# Altium footprint library ref-packages.PCBLIB: 1544 footprints (part 69 of 103)
Each footprint in its own frame and in the unit in brackets; x right, y up, seen from the top. Pads: shape width x height; smd on the part's side, far side on the other; paste and mask are expansions set on the pad; w line width, h text height; cw(c..) or ccw(c..) is an arc to the next point about the centre after c.
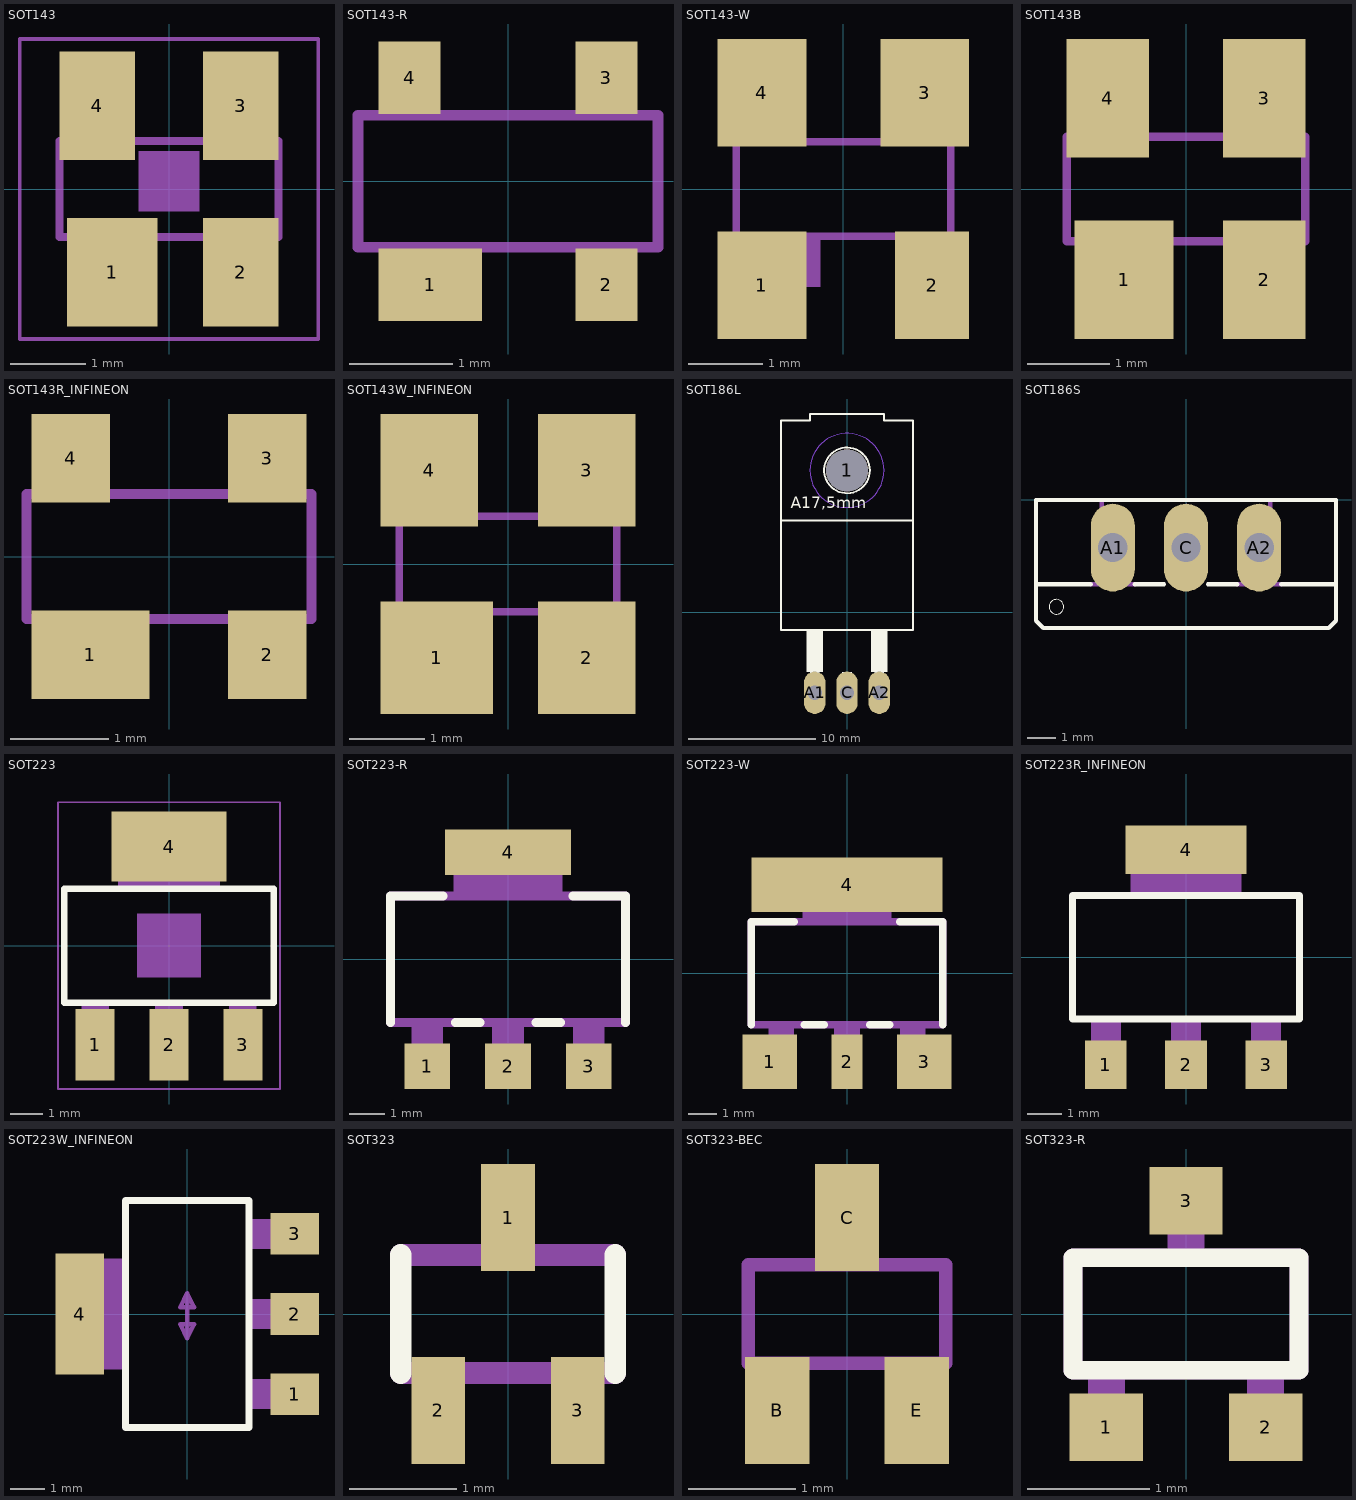
[diagram p68: the footprints below, top view; thin cyan lines are the x and y axes]

## SOT143 [mm]
pads (4):
  rect 1.2x1.44 smd: 1(-0.75,-1.1)
  rect 1x1.44 smd: 2(0.95,-1.1) 3(0.95,1.1) 4(-0.95,1.1)
Mechanical 6:
  rectangle: -0.4,-0.3 0.4,0.5
Mechanical 16:
  rectangle: 0.737,-1.321 1.194,-0.635
  rectangle: 0.711,0.635 1.168,1.321
  rectangle: -1.143,0.635 -0.686,1.321
  rectangle: -1.194,-1.321 -0.305,-0.635
  lines w0.102: -1.448,-0.635 1.448,-0.635 1.448,0.635 -1.448,0.635 -1.448,-0.635
Mechanical 27:
  lines w0.051: -1.973,-1.983 1.973,-1.983 1.973,1.983 -1.973,1.983 -1.973,-1.983

## SOT143-R [mm]
pads (4):
  rect 1x0.7 smd: 1(-0.75,-1)
  rect 0.6x0.7 smd: 2(0.95,-1) 3(0.95,1) 4(-0.95,1)
Mechanical 16:
  rectangle: 0.737,-1.321 1.194,-0.635
  rectangle: 0.711,0.635 1.168,1.321
  rectangle: -1.143,0.635 -0.686,1.321
  rectangle: -1.194,-1.321 -0.305,-0.635
  lines w0.102: -1.448,-0.635 1.448,-0.635 1.448,0.635 -1.448,0.635 -1.448,-0.635

## SOT143-W [mm]
pads (4):
  rect 1.2x1.45 smd: 1(-1.1,-1.3) 3(1.1,1.3) 4(-1.1,1.3)
  rect 1x1.45 smd: 2(1.2,-1.3)
Mechanical 16:
  rectangle: 0.737,-1.321 1.194,-0.635
  rectangle: 0.711,0.635 1.168,1.321
  rectangle: -1.143,0.635 -0.686,1.321
  rectangle: -1.194,-1.321 -0.305,-0.635
  lines w0.102: -1.448,-0.635 1.448,-0.635 1.448,0.635 -1.448,0.635 -1.448,-0.635

## SOT143B [mm]
pads (4):
  rect 1.2x1.44 smd: 1(-0.75,-1.1)
  rect 1x1.44 smd: 2(0.95,-1.1) 3(0.95,1.1) 4(-0.95,1.1)
Mechanical 16:
  rectangle: 0.737,-1.321 1.194,-0.635
  rectangle: 0.711,0.635 1.168,1.321
  rectangle: -1.143,0.635 -0.686,1.321
  rectangle: -1.194,-1.321 -0.305,-0.635
  lines w0.102: -1.448,-0.635 1.448,-0.635 1.448,0.635 -1.448,0.635 -1.448,-0.635

## SOT143R_INFINEON [mm]
pads (4):
  rect 1.2x0.9 smd: 1(-0.8,-1)
  rect 0.8x0.9 smd: 2(1,-1) 3(1,1) 4(-1,1)
Mechanical 16:
  rectangle: 0.737,-1.321 1.194,-0.635
  rectangle: 0.711,0.635 1.168,1.321
  rectangle: -1.143,0.635 -0.686,1.321
  rectangle: -1.194,-1.321 -0.305,-0.635
  lines w0.102: -1.448,-0.635 -1.448,0.635 1.448,0.635 1.448,-0.635 -1.448,-0.635

## SOT143W_INFINEON [mil]
pads (4):
  rect 59.06x59.06 smd: 1(-37.4,-49.21)
  rect 51.18x59.06 smd: 2(41.34,-49.21) 3(41.34,49.21) 4(-41.34,49.21)
Mechanical 16:
  rectangle: 29,-52 47,-25
  rectangle: 28,25 46,52
  rectangle: -45,25 -27,52
  rectangle: -47,-52 -12,-25
  lines w4: -57,-25 57,-25 57,25 -57,25 -57,-25

## SOT186L [mil]
pads (4):
  round 130 hole 130: 1(0,440)
  oval 66x132 hole 44: A1(-100,-250) A2(100,-250) C(0,-250)
Bottom Layer keep-out:
  circle w0: c0,440 r115
Top Overlay:
  circle w6: c0,440 r71
  rectangle: -125,-185 -75,-55
  rectangle: 75,-185 125,-55
  rectangle: 85,-190 115,-185
  rectangle: -115,-190 -85,-185
  rectangle: -15,-190 15,-185
  lines w6: -205,285 -205,-55 205,-55 205,285 ; -205,285 205,285 ; -205,285 -205,595 -115,595 -115,615 115,615 115,595 205,595 205,285
  text "A17,5mm" at -175,310 h60.45
Mechanical 16:
  rectangle: 85,-255 115,-190
  rectangle: -115,-255 -85,-190
  rectangle: -15,-255 15,-190
Via Holes:
  circle w0: c0,440 r115

## SOT186S [mil]
pads (3):
  oval 60x120 hole 40: A1(-100,-65) A2(100,-65) C(0,-65)
Top Overlay:
  circle w0: c-177,-146 r10
  lines w6: -130,-115 -205,-115 ; -70,-115 -30,-115 ; 30,-115 70,-115 ; 130,-115 205,-115 ; -205,-115 -205,-165 -195,-175 195,-175 205,-165 205,-115 ; -205,-115 -205,0 205,0 205,-115
Mechanical 16:
  lines w6: -130,-115 -115,-115 ; -115,0 -115,-115 ; -70,-115 -115,-115 ; 70,-115 115,-115 ; 115,0 115,-115 ; 130,-115 115,-115

## SOT223 [mil]
pads (4):
  rect 47.99x87.99 smd: 1(-90.98,-122.01) 2(0,-122.01) 3(90.98,-122.01)
  rect 141.73x86.61 smd: 4(0,122.01)
Top Overlay:
  lines w8: -129.02,-70 129.02,-70 129.02,70 -129.02,70 -129.02,-70
Mechanical 6:
  rectangle: -39.37,-39.37 39.37,39.37
Mechanical 16:
  rectangle: -63,71 63,144
  rectangle: -17,-144 17,-71
  rectangle: -108,-144 -74,-71
  rectangle: 74,-144 108,-71
  rectangle: -63,71 63,144
  rectangle: -17,-144 17,-71
  rectangle: -108,-144 -74,-71
  rectangle: 74,-144 108,-71
Mechanical 27:
  lines w2: -136.73,-176.5 136.73,-176.5 136.73,176.5 -136.73,176.5 -136.73,-176.5

## SOT223-R [mil]
pads (4):
  rect 51.18x51.18 smd: 1(-90.55,-120.08) 2(0,-120.08) 3(90.55,-120.08)
  rect 141.73x51.18 smd: 4(0,120.08)
Top Overlay:
  lines w10: -131.89,-70.87 -131.89,70.87 -72.83,70.87 ; -59.06,-70.87 -31.5,-70.87 ; 31.5,-70.87 59.06,-70.87 ; 72.83,70.87 131.89,70.87 131.89,-70.87
Mechanical 16:
  rectangle: -108.27,-135.83 -72.83,-74.8
  rectangle: -17.72,-135.83 17.72,-74.8
  rectangle: 72.83,-135.83 108.27,-74.8
  rectangle: -61.02,74.8 61.02,135.83
  lines w10: -131.89,-70.87 -131.89,70.87 131.89,70.87 131.89,-70.87 -131.89,-70.87

## SOT223-W [mm]
pads (4):
  rect 1.9x1.9 smd: 1(-2.7,-3.1) 3(2.7,-3.1)
  rect 1.1x1.9 smd: 2(0,-3.1)
  rect 6.7x1.9 smd: 4(0,3.1)
Top Overlay:
  lines w0.254: -3.35,-1.8 -3.35,1.8 -1.85,1.8 ; -1.5,-1.8 -0.8,-1.8 ; 0.8,-1.8 1.5,-1.8 ; 1.85,1.8 3.35,1.8 3.35,-1.8
Mechanical 16:
  rectangle: -2.75,-3.45 -1.85,-1.9
  rectangle: -0.45,-3.45 0.45,-1.9
  rectangle: 1.85,-3.45 2.75,-1.9
  rectangle: -1.55,1.9 1.55,3.45
  lines w0.254: -3.35,-1.8 -3.35,1.8 3.35,1.8 3.35,-1.8 -3.35,-1.8

## SOT223R_INFINEON [mil]
pads (4):
  rect 47.24x55.12 smd: 1(-90.98,-122.01) 2(0,-122.01) 3(90.98,-122.01)
  rect 137.8x55.12 smd: 4(0,122.01)
Top Overlay:
  lines w8: -129.02,-70 129.02,-70 129.02,70 -129.02,70 -129.02,-70
Mechanical 16:
  rectangle: -63,71 63,144
  rectangle: -17,-144 17,-71
  rectangle: -108,-144 -74,-71
  rectangle: 74,-144 108,-71
  rectangle: -63,71 63,144
  rectangle: -17,-144 17,-71
  rectangle: -108,-144 -74,-71
  rectangle: 74,-144 108,-71

## SOT223W_INFINEON [mil]
pads (4):
  rect 55.12x47.24 smd: 1(122.01,-90.98) 2(122.01,0) 3(122.01,90.98)
  rect 55.12x137.8 smd: 4(-122.01,0)
Top Overlay:
  lines w8: -70,-129.02 70,-129.02 70,129.02 -70,129.02 -70,-129.02
Mechanical 13:
  lines w5: 0,-27.56 0,23.62 ; 0,-27.56 7.87,-11.81 -7.87,-11.81 0,-27.56 ; 0,23.62 -7.87,7.87 7.87,7.87 0,23.62
  text "direction of pcb" at 15.75,15.75 h15.5
  text "transportation for" at 15.75,-1.97 h15.5
  text "wavesoldering" at 15.75,-19.69 h15.5
Mechanical 16:
  rectangle: -144,-63 -71,63
  rectangle: 71,-17 144,17
  rectangle: 71,-108 144,-74
  rectangle: 71,74 144,108
  rectangle: -144,-63 -71,63
  rectangle: 71,-17 144,17
  rectangle: 71,-108 144,-74
  rectangle: 71,74 144,108

## SOT323 [mm]
pads (3):
  rect 0.5x1 smd: 1(0,0.9) 2(-0.65,-0.9) 3(0.65,-0.9)
Top Overlay:
  lines w0.203: -1,-0.55 -1,0.55 ; 1,-0.55 1,0.55
Mechanical 16:
  rectangle: -0.15,0.65 0.15,1.2
  rectangle: -0.8,-1.2 -0.5,-0.65
  rectangle: 0.5,-1.2 0.8,-0.65
  lines w0.203: -1,-0.55 1,-0.55 ; -1,0.55 1,0.55

## SOT323-BEC [mm]
pads (3):
  rect 0.6x1 smd: B(-0.65,-0.9) C(0,0.9) E(0.65,-0.9)
Mechanical 16:
  rectangle: -0.8,-1.1 -0.5,-0.5
  rectangle: 0.5,-1.1 0.8,-0.5
  rectangle: -0.15,0.5 0.15,1.1
  lines w0.127: -0.923,-0.461 0.923,-0.461 0.923,0.461 -0.923,0.461 -0.923,-0.461

## SOT323-R [mm]
pads (3):
  rect 0.6x0.55 smd: 1(-0.65,-0.925) 2(0.65,-0.925) 3(0,0.925)
Top Overlay:
  lines w0.152: -0.923,-0.461 0.923,-0.461 0.923,0.461 -0.923,0.461 -0.923,-0.461
Mechanical 16:
  rectangle: -0.8,-1.1 -0.5,-0.5
  rectangle: 0.5,-1.1 0.8,-0.5
  rectangle: -0.15,0.5 0.15,1.1
  lines w0.152: -0.923,-0.461 0.923,-0.461 0.923,0.461 -0.923,0.461 -0.923,-0.461